# Altium footprint library Conectores.PcbLib: 122 footprints (part 3 of 8)
Each footprint in its own frame and in the unit in brackets; x right, y up, seen from the top. Pads: shape width x height; smd on the part's side, far side on the other; paste and mask are expansions set on the pad; w line width, h text height; cw(c..) or ccw(c..) is an arc to the next point about the centre after c.
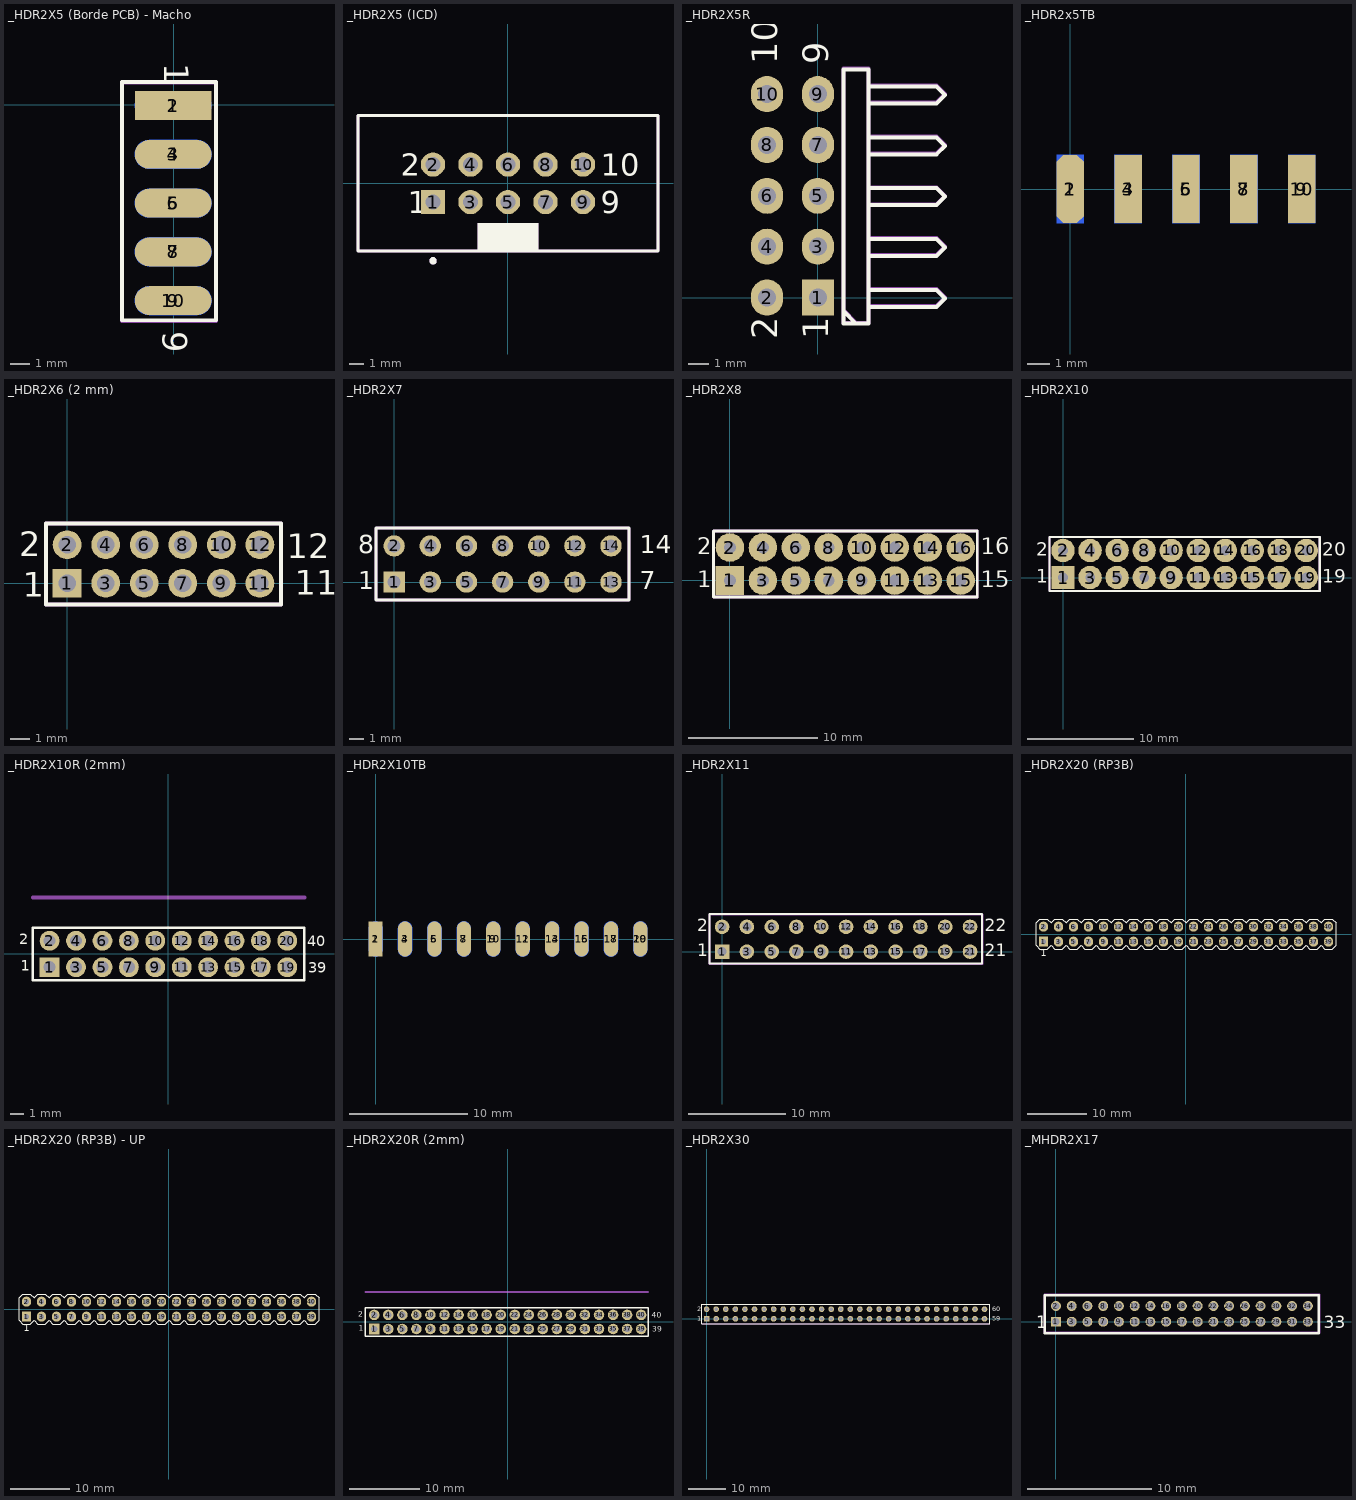
[diagram p2: the footprints below, top view; thin cyan lines are the x and y axes]

## _HDR2X5 (Borde PCB) - Macho [mm] "2 Filas 5 pines para conector macho"
pads (10):
  rect 4x1.5 smd: 1(-0.025,-0.051)
  oval 4x1.5 smd far side: 2(-0.025,-0.051) 4(-0.025,-2.591) 6(-0.025,-5.131) 8(-0.025,-7.671) 10(-0.025,-10.211)
  oval 4x1.5 smd: 3(-0.025,-2.591) 5(-0.025,-5.131) 7(-0.025,-7.671) 9(-0.025,-10.211)
Top Overlay:
  lines w0.2: -2.692,-11.238 -2.692,1.183 2.21,1.183 2.21,-11.238 -2.692,-11.238
  text "9" at -0.559,-11.796 h1.27
  text "1" at -0.483,2.148 h1.27
Mechanical 29:
  lines w0.2: -2.692,-11.278 2.21,-11.278 2.21,1.143 -2.692,1.143 -2.692,-11.278
  text "'.Designator'" at -0.062,0.368 h0.5
  text "1" at -0.483,2.108 h1.27
  text "9" at -0.559,-11.836 h1.27

## _HDR2X5 (ICD) [mm] "2 Filas 5 pines"
pads (10):
  rect 1.65x1.65 hole 1: 1(-5.08,-1.27)
  round 1.65 hole 1: 2(-5.08,1.27) 3(-2.54,-1.27) 4(-2.54,1.27) 5(0,-1.27) 6(0,1.27) 7(2.54,-1.27) 8(2.54,1.27) 9(5.08,-1.27) 10(5.08,1.27)
Top Overlay:
  circle w0.25: c-5.08,-5.25 r0.125
  rectangle: -2.05,-4.6 2.05,-2.7
  lines w0.2: -10.16,-4.6 10.16,-4.6 10.16,4.6 -10.16,4.6 -10.16,-4.6
  text "9" at 6.28,-2.02 h1.5
  text "10" at 6.28,0.52 h1.5
  text "1" at -6.78,-2.02 h1.5
  text "2" at -7.28,0.52 h1.5
Mechanical 13:
  lines w0.1: -10.16,-4.6 10.16,-4.6 10.16,4.6 -10.16,4.6 -10.16,-4.6
Mechanical 29:
  circle w0.25: c-5.08,-5.25 r0.125
  rectangle: -2.05,-4.6 2.05,-2.7
  lines w0.2: -10.16,-4.6 -10.16,4.6 10.16,4.6 10.16,-4.6 -10.16,-4.6
  text "2" at -7.28,0.52 h1.5
  text "1" at -6.78,-2.02 h1.5
  text "10" at 6.28,0.52 h1.5
  text "9" at 6.28,-2.02 h1.5
  text "'.Designator'" at -9.478,-4.062 h0.5
3D body "Header 10 pines ICD.step": height 9.86, standoff -3.05, extent -10.135,-4.572 10.185,4.572

## _HDR2X5R [mm]
pads (10):
  rect 1.6x1.8 hole 0.9: 1(0,0)
  oval 1.6x1.8 hole 0.9: 2(-2.54,0) 3(0,2.54) 4(-2.54,2.54) 5(0,5.08) 6(-2.54,5.08) 7(0,7.62) 8(-2.54,7.62) 9(0,10.16) 10(-2.54,10.16)
Top Overlay:
  lines w0.2: 1.27,-0.675 1.905,-1.31 ; 2.54,-0.463 5.927,-0.463 6.35,-0.04 5.927,0.383 2.54,0.383 ; 2.54,2.077 5.927,2.077 6.35,2.5 5.927,2.923 2.54,2.923 ; 2.54,4.617 5.927,4.617 6.35,5.04 5.927,5.463 2.54,5.463 ; 2.54,7.157 5.927,7.157 6.35,7.58 5.927,8.003 2.54,8.003 ; 2.54,9.697 5.927,9.697 6.35,10.12 5.927,10.543 2.54,10.543 ; 1.27,-1.31 2.54,-1.31 2.54,11.39 1.27,11.39 1.27,-1.31
  text "10" at -2.032,11.644 h1.27
  text "9" at 0.508,11.644 h1.27
  text "1" at 0.508,-2.072 h1.27
  text "2" at -2.032,-2.072 h1.27
Mechanical 29:
  lines w0.2: 1.27,-0.635 1.905,-1.27 ; 2.54,-0.423 5.927,-0.423 6.35,0 5.927,0.423 2.54,0.423 ; 2.54,2.117 5.927,2.117 6.35,2.54 5.927,2.963 2.54,2.963 ; 2.54,4.657 5.927,4.657 6.35,5.08 5.927,5.503 2.54,5.503 ; 2.54,7.197 5.927,7.197 6.35,7.62 5.927,8.043 2.54,8.043 ; 2.54,9.737 5.927,9.737 6.35,10.16 5.927,10.583 2.54,10.583 ; 1.27,-1.27 1.27,11.43 2.54,11.43 2.54,-1.27 1.27,-1.27
  text "2" at -2.032,-2.032 h1.27
  text "1" at 0.508,-2.032 h1.27
  text "9" at 0.508,11.684 h1.27
  text "10" at -2.032,11.684 h1.27
  text "'.Designator'" at 0.232,-0.538 h0.5
3D body "HDR2x5 Right.STEP": height 5.27, standoff -3, extent -2.864,-1.296 8.836,11.404

## _HDR2x5TB [mm]
pads (10):
  oct 1.2x3 smd: 1(0,0)
  rect 1.2x3 smd far side: 2(0,0) 4(2.54,0) 6(5.08,0) 8(7.62,0) 10(10.16,0)
  rect 1.2x3 smd: 3(2.54,0) 5(5.08,0) 7(7.62,0) 9(10.16,0)
Mechanical 29:
  text "'.Designator'" at -0.388,-0.032 h0.5

## _HDR2X6 (2 mm) [mm]
pads (12):
  rect 1.5x1.5 hole 0.9: 1(0,0)
  round 1.5 hole 0.9: 2(0,2) 3(2,0) 4(2,2) 5(4,0) 6(4,2) 7(6,0) 8(6,2) 9(8,0) 10(8,2) 11(10,0) 12(10,2)
Top Overlay:
  lines w0.2: -1.1,-1.1 11.1,-1.1 11.1,3.1 -1.1,3.1 -1.1,-1.1
  text "12" at 11.4,1.3 h1.27
  text "11" at 11.8,-0.6 h1.27
  text "1" at -2.3,-0.7 h1.27
  text "2" at -2.5,1.4 h1.27
Mechanical 29:
  lines w0.2: -1.1,-1.1 -1.1,3.1 11.1,3.1 11.1,-1.1 -1.1,-1.1
  text "'.Designator'" at -0.538,-0.232 h0.5
  text "2" at -2.5,1.4 h1.27
  text "1" at -2.3,-0.7 h1.27
  text "11" at 11.8,-0.6 h1.27
  text "12" at 11.4,1.3 h1.27

## _HDR2X7 [mm]
pads (14):
  rect 1.5x1.5 hole 0.9: 1(0,0)
  round 1.5 hole 0.9: 2(0,2.54) 3(2.54,0) 4(2.54,2.54) 5(5.08,0) 6(5.08,2.54) 7(7.62,0) 8(7.62,2.54) 9(10.16,0) 10(10.16,2.54) 11(12.7,0) 12(12.7,2.54) 13(15.24,0) 14(15.24,2.54)
Top Overlay:
  lines w0.2: -1.27,-1.27 16.51,-1.27 16.51,3.81 -1.27,3.81 -1.27,-1.27
  text "8" at -2.54,2.032 h1.27
  text "1" at -2.54,-0.508 h1.27
  text "7" at 17.272,-0.508 h1.27
  text "14" at 17.272,2.032 h1.27
Mechanical 29:
  lines w0.2: -1.27,-1.27 -1.27,3.81 16.51,3.81 16.51,-1.27 -1.27,-1.27
  text "'.Designator'" at -0.538,-0.232 h0.5
  text "14" at 17.272,2.032 h1.27
  text "7" at 17.272,-0.508 h1.27
  text "1" at -2.54,-0.508 h1.27
  text "8" at -2.54,2.032 h1.27
3D body "_HDR2x7.STEP": height 10.1, standoff -1.5, extent -1.27,-1.27 16.51,3.81

## _HDR2X8 [mm]
pads (16):
  rect 2.2x2.2 hole 0.9: 1(0,0)
  round 2.2 hole 0.9: 2(0,2.54) 3(2.54,0) 4(2.54,2.54) 5(5.08,0) 6(5.08,2.54) 7(7.62,0) 8(7.62,2.54) 9(10.16,0) 10(10.16,2.54) 11(12.7,0) 12(12.7,2.54) 13(15.24,0) 14(15.24,2.54) 15(17.78,0) 16(17.78,2.54)
Top Overlay:
  lines w0.2: -1.27,-1.27 -1.27,3.81 19.05,3.81 19.05,-1.27 -1.27,-1.27
  text "2" at -2.54,2.032 h1.27
  text "1" at -2.54,-0.508 h1.27
  text "15" at 19.304,-0.508 h1.27
  text "16" at 19.304,2.032 h1.27
Mechanical 29:
  lines w0.2: -1.27,-1.27 19.05,-1.27 19.05,3.81 -1.27,3.81 -1.27,-1.27
  text "16" at 19.304,2.032 h1.27
  text "15" at 19.304,-0.508 h1.27
  text "1" at -2.54,-0.508 h1.27
  text "2" at -2.54,2.032 h1.27
  text "'.Designator'" at -0.538,-0.232 h0.5
3D body "_HDR2x8.STEP": height 10.1, standoff -1.5, extent -1.295,-1.295 19.025,3.785

## _HDR2X10 [mm]
pads (20):
  rect 2.2x2.2 hole 0.9: 1(0,0)
  round 2.2 hole 0.9: 2(0,2.54) 3(2.54,0) 4(2.54,2.54) 5(5.08,0) 6(5.08,2.54) 7(7.62,0) 8(7.62,2.54) 9(10.16,0) 10(10.16,2.54) 11(12.7,0) 12(12.7,2.54) 13(15.24,0) 14(15.24,2.54) 15(17.78,0) 16(17.78,2.54) 17(20.32,0) 18(20.32,2.54) 19(22.86,0) 20(22.86,2.54)
Top Overlay:
  lines w0.2: -1.27,-1.27 -1.27,3.81 0.635,3.81 24.13,3.81 24.13,-1.27 0.635,-1.27 -1.27,-1.27
  text "2" at -2.54,2.032 h1.27
  text "1" at -2.54,-0.508 h1.27
  text "19" at 24.384,-0.508 h1.27
  text "20" at 24.384,2.032 h1.27
Mechanical 29:
  lines w0.2: -1.27,-1.27 0.635,-1.27 24.13,-1.27 24.13,3.81 0.635,3.81 -1.27,3.81 -1.27,-1.27
  text "'.Designator'" at -0.538,-0.232 h0.5
  text "20" at 24.384,2.032 h1.27
  text "19" at 24.384,-0.508 h1.27
  text "1" at -2.54,-0.508 h1.27
  text "2" at -2.54,2.032 h1.27
3D body "_HDR2x10.STEP": height 10.1, standoff -1.5, extent -1.27,-1.27 24.13,3.81

## _HDR2X10R (2mm) [mm] "Connector Socket; 20x2 Position (2mm pitch) P/N: TMMH-110-01-L-D-RA"
pads (20):
  rect 1.5x1.5 hole 0.9: 1(-9,-1)
  round 1.5 hole 0.9: 2(-9,1) 3(-7,-1) 4(-7,1) 5(-5,-1) 6(-5,1) 7(-3,-1) 8(-3,1) 9(-1,-1) 10(-1,1) 11(1,-1) 12(1,1) 13(3,-1) 14(3,1) 15(5,-1) 16(5,1) 17(7,-1) 18(7,1) 19(9,-1) 20(9,1)
Top Overlay:
  lines w0.2: -10.27,-2 10.27,-2 10.27,2 -10.27,2 -10.27,-2
  text "1" at -11.19,-1.27 h0.8
  text "2" at -11.32,0.75 h0.8
  text "40" at 10.52,0.58 h0.8
  text "39" at 10.6,-1.42 h0.8
Mechanical 1:
  lines w0.3: -10.25,4.27 10.3,4.27
3D body "TMMH-110-01-L-D-RA.stp": height 4.04, standoff -2.56, extent -10,-1.265 10,7.465

## _HDR2X10TB [mm]
pads (20):
  rect 1.2x3 smd: 1(0,0)
  oval 1.2x3 smd far side: 2(0,0) 4(2.5,0) 6(5,0) 8(7.5,0) 10(10,0) 12(12.5,0) 14(15,0) 16(17.5,0) 18(20,0) 20(22.5,0)
  oval 1.2x3 smd: 3(2.5,0) 5(5,0) 7(7.5,0) 9(10,0) 11(12.5,0) 13(15,0) 15(17.5,0) 17(20,0) 19(22.5,0)
Mechanical 29:
  text "'.Designator'" at -0.378,-0.042 h0.5
3D body "_HDR2x10.STEP": height 1.27, standoff -3.81, extent -1.499,-11.422 23.901,0.178

## _HDR2X11 [mm] "Connector; Header; 11x2 Position"
pads (22):
  rect 1.5x1.5 hole 0.9: 1(0,0)
  round 1.5 hole 0.9: 2(0,2.54) 3(2.54,0) 4(2.54,2.54) 5(5.08,0) 6(5.08,2.54) 7(7.62,0) 8(7.62,2.54) 9(10.16,0) 10(10.16,2.54) 11(12.7,0) 12(12.7,2.54) 13(15.24,0) 14(15.24,2.54) 15(17.78,0) 16(17.78,2.54) 17(20.32,0) 18(20.32,2.54) 19(22.86,0) 20(22.86,2.54) 21(25.4,0) 22(25.4,2.54)
Top Overlay:
  lines w0.2: -1.3,-1.22 -1.3,3.86 26.64,3.86 26.64,-1.22 -1.3,-1.22
  text "1" at -2.57,-0.458 h1.27
  text "2" at -2.57,2.082 h1.27
  text "21" at 26.894,-0.458 h1.27
  text "22" at 26.894,2.082 h1.27
Mechanical 29:
  lines w0.2: -1.27,-1.27 26.67,-1.27 26.67,3.81 -1.27,3.81 -1.27,-1.27
  text "22" at 26.924,2.032 h1.27
  text "21" at 26.924,-0.508 h1.27
  text "2" at -2.54,2.032 h1.27
  text "1" at -2.54,-0.508 h1.27
  text "'.Designator'" at -0.538,-0.232 h0.5

## _HDR2X20 (RP3B) [mm] "Conector Raspberry Pi 3B"
pads (40):
  rect 1.6x1.7 hole 0.9: 1(-24.13,-1.27)
  oval 1.6x1.7 hole 0.9: 2(-24.13,1.27) 3(-21.59,-1.27) 4(-21.59,1.27) 5(-19.05,-1.27) 6(-19.05,1.27) 7(-16.51,-1.27) 8(-16.51,1.27) 9(-13.97,-1.27) 10(-13.97,1.27) 11(-11.43,-1.27) 12(-11.43,1.27) 13(-8.89,-1.27) 14(-8.89,1.27) 15(-6.35,-1.27) 16(-6.35,1.27) 17(-3.81,-1.27) 18(-3.81,1.27) 19(-1.27,-1.27) 20(-1.27,1.27) 21(1.27,-1.27) 22(1.27,1.27) 23(3.81,-1.27) 24(3.81,1.27) 25(6.35,-1.27) 26(6.35,1.27) 27(8.89,-1.27) 28(8.89,1.27) 29(11.43,-1.27) 30(11.43,1.27) 31(13.97,-1.27) 32(13.97,1.27) 33(16.51,-1.27) 34(16.51,1.27) 35(19.05,-1.27) 36(19.05,1.27) 37(21.59,-1.27) 38(21.59,1.27) 39(24.13,-1.27) 40(24.13,1.27)
Top Overlay:
  lines w0.152: -25.4,-1.905 -25.4,1.905 -24.765,2.54 -23.495,2.54 -22.86,1.905 -22.225,2.54 -20.955,2.54 -20.32,1.905 -19.685,2.54 -18.415,2.54 -17.78,1.905 -17.145,2.54 -15.875,2.54 -15.24,1.905 -14.605,2.54 -13.335,2.54 -12.7,1.905 -12.065,2.54 -10.795,2.54 -10.16,1.905 -9.525,2.54 -8.255,2.54 -7.62,1.905 -6.985,2.54 -5.715,2.54 -5.08,1.905 -4.445,2.54 -3.175,2.54 -2.54,1.905 -1.905,2.54 -0.635,2.54 0,1.905 0.635,2.54 1.905,2.54 2.54,1.905 3.175,2.54 4.445,2.54 5.08,1.905 5.715,2.54 6.985,2.54 7.62,1.905 8.255,2.54 9.525,2.54 10.16,1.905 10.795,2.54 12.065,2.54 12.7,1.905 13.335,2.54 14.605,2.54 15.24,1.905 15.875,2.54 17.145,2.54 17.78,1.905 18.415,2.54 19.685,2.54 20.32,1.905 20.955,2.54 22.225,2.54 22.86,1.905 23.495,2.54 24.765,2.54 25.4,1.905 25.4,-1.905 24.765,-2.54 23.495,-2.54 22.86,-1.905 22.225,-2.54 20.955,-2.54 20.32,-1.905 19.685,-2.54 18.415,-2.54 17.78,-1.905 17.145,-2.54 15.875,-2.54 15.24,-1.905 14.605,-2.54 13.335,-2.54 12.7,-1.905 12.065,-2.54 10.795,-2.54 10.16,-1.905 9.525,-2.54 8.255,-2.54 7.62,-1.905 6.985,-2.54 5.715,-2.54 5.08,-1.905 4.445,-2.54 3.175,-2.54 2.54,-1.905 1.905,-2.54 0.635,-2.54 0,-1.905 -0.635,-2.54 -1.905,-2.54 -2.54,-1.905 -3.175,-2.54 -4.445,-2.54 -5.08,-1.905 -5.715,-2.54 -6.985,-2.54 -7.62,-1.905 -8.255,-2.54 -9.525,-2.54 -10.16,-1.905 -10.795,-2.54 -12.065,-2.54 -12.7,-1.905 -13.335,-2.54 -14.605,-2.54 -15.24,-1.905 -15.875,-2.54 -17.145,-2.54 -17.78,-1.905 -18.415,-2.54 -19.685,-2.54 -20.32,-1.905 -20.955,-2.54 -22.225,-2.54 -22.86,-1.905 -23.495,-2.54 -24.765,-2.54 -25.4,-1.905
  text "1" at -24.638,-4.191 h1.97
Mechanical 16:
  rectangle: -21.844,-1.524 -21.336,-1.016
  rectangle: -24.384,-1.524 -23.876,-1.016
  rectangle: -19.304,-1.524 -18.796,-1.016
  rectangle: -14.224,-1.524 -13.716,-1.016
  rectangle: -16.764,-1.524 -16.256,-1.016
  rectangle: -11.684,-1.524 -11.176,-1.016
  rectangle: -24.384,1.016 -23.876,1.524
  rectangle: -21.844,1.016 -21.336,1.524
  rectangle: -19.304,1.016 -18.796,1.524
  rectangle: -16.764,1.016 -16.256,1.524
  rectangle: -14.224,1.016 -13.716,1.524
  rectangle: -11.684,1.016 -11.176,1.524
  rectangle: -9.144,1.016 -8.636,1.524
  rectangle: -9.144,-1.524 -8.636,-1.016
  rectangle: -4.064,-1.524 -3.556,-1.016
  rectangle: -6.604,-1.524 -6.096,-1.016
  rectangle: -1.524,-1.524 -1.016,-1.016
  rectangle: 3.556,-1.524 4.064,-1.016
  rectangle: 1.016,-1.524 1.524,-1.016
  rectangle: 6.096,-1.524 6.604,-1.016
  rectangle: -6.604,1.016 -6.096,1.524
  rectangle: -4.064,1.016 -3.556,1.524
  rectangle: -1.524,1.016 -1.016,1.524
  rectangle: 1.016,1.016 1.524,1.524
  rectangle: 3.556,1.016 4.064,1.524
  rectangle: 6.096,1.016 6.604,1.524
  rectangle: 8.636,1.016 9.144,1.524
  rectangle: 8.636,-1.524 9.144,-1.016
  rectangle: 13.716,-1.524 14.224,-1.016
  rectangle: 11.176,-1.524 11.684,-1.016
  rectangle: 16.256,-1.524 16.764,-1.016
  rectangle: 21.336,-1.524 21.844,-1.016
  rectangle: 18.796,-1.524 19.304,-1.016
  rectangle: 23.876,-1.524 24.384,-1.016
  rectangle: 11.176,1.016 11.684,1.524
  rectangle: 13.716,1.016 14.224,1.524
  rectangle: 16.256,1.016 16.764,1.524
  rectangle: 18.796,1.016 19.304,1.524
  rectangle: 21.336,1.016 21.844,1.524
  rectangle: 23.876,1.016 24.384,1.524
3D body "Header 2x20 2_54mm.STEP": height 2.18, standoff -8.92, extent -25.54,-2.48 25.56,2.52

## _HDR2X20 (RP3B) - UP [mm] "Conector Raspberry Pi 3B"
pads (40):
  rect 1.6x1.7 hole 0.9: 1(-24.13,-1.27)
  oval 1.6x1.7 hole 0.9: 2(-24.13,1.27) 3(-21.59,-1.27) 4(-21.59,1.27) 5(-19.05,-1.27) 6(-19.05,1.27) 7(-16.51,-1.27) 8(-16.51,1.27) 9(-13.97,-1.27) 10(-13.97,1.27) 11(-11.43,-1.27) 12(-11.43,1.27) 13(-8.89,-1.27) 14(-8.89,1.27) 15(-6.35,-1.27) 16(-6.35,1.27) 17(-3.81,-1.27) 18(-3.81,1.27) 19(-1.27,-1.27) 20(-1.27,1.27) 21(1.27,-1.27) 22(1.27,1.27) 23(3.81,-1.27) 24(3.81,1.27) 25(6.35,-1.27) 26(6.35,1.27) 27(8.89,-1.27) 28(8.89,1.27) 29(11.43,-1.27) 30(11.43,1.27) 31(13.97,-1.27) 32(13.97,1.27) 33(16.51,-1.27) 34(16.51,1.27) 35(19.05,-1.27) 36(19.05,1.27) 37(21.59,-1.27) 38(21.59,1.27) 39(24.13,-1.27) 40(24.13,1.27)
Top Overlay:
  lines w0.152: -25.4,-1.905 -25.4,1.905 -24.765,2.54 -23.495,2.54 -22.86,1.905 -22.225,2.54 -20.955,2.54 -20.32,1.905 -19.685,2.54 -18.415,2.54 -17.78,1.905 -17.145,2.54 -15.875,2.54 -15.24,1.905 -14.605,2.54 -13.335,2.54 -12.7,1.905 -12.065,2.54 -10.795,2.54 -10.16,1.905 -9.525,2.54 -8.255,2.54 -7.62,1.905 -6.985,2.54 -5.715,2.54 -5.08,1.905 -4.445,2.54 -3.175,2.54 -2.54,1.905 -1.905,2.54 -0.635,2.54 0,1.905 0.635,2.54 1.905,2.54 2.54,1.905 3.175,2.54 4.445,2.54 5.08,1.905 5.715,2.54 6.985,2.54 7.62,1.905 8.255,2.54 9.525,2.54 10.16,1.905 10.795,2.54 12.065,2.54 12.7,1.905 13.335,2.54 14.605,2.54 15.24,1.905 15.875,2.54 17.145,2.54 17.78,1.905 18.415,2.54 19.685,2.54 20.32,1.905 20.955,2.54 22.225,2.54 22.86,1.905 23.495,2.54 24.765,2.54 25.4,1.905 25.4,-1.905 24.765,-2.54 23.495,-2.54 22.86,-1.905 22.225,-2.54 20.955,-2.54 20.32,-1.905 19.685,-2.54 18.415,-2.54 17.78,-1.905 17.145,-2.54 15.875,-2.54 15.24,-1.905 14.605,-2.54 13.335,-2.54 12.7,-1.905 12.065,-2.54 10.795,-2.54 10.16,-1.905 9.525,-2.54 8.255,-2.54 7.62,-1.905 6.985,-2.54 5.715,-2.54 5.08,-1.905 4.445,-2.54 3.175,-2.54 2.54,-1.905 1.905,-2.54 0.635,-2.54 0,-1.905 -0.635,-2.54 -1.905,-2.54 -2.54,-1.905 -3.175,-2.54 -4.445,-2.54 -5.08,-1.905 -5.715,-2.54 -6.985,-2.54 -7.62,-1.905 -8.255,-2.54 -9.525,-2.54 -10.16,-1.905 -10.795,-2.54 -12.065,-2.54 -12.7,-1.905 -13.335,-2.54 -14.605,-2.54 -15.24,-1.905 -15.875,-2.54 -17.145,-2.54 -17.78,-1.905 -18.415,-2.54 -19.685,-2.54 -20.32,-1.905 -20.955,-2.54 -22.225,-2.54 -22.86,-1.905 -23.495,-2.54 -24.765,-2.54 -25.4,-1.905
  text "1" at -24.638,-4.191 h1.97
Mechanical 16:
  rectangle: -21.844,-1.524 -21.336,-1.016
  rectangle: -24.384,-1.524 -23.876,-1.016
  rectangle: -19.304,-1.524 -18.796,-1.016
  rectangle: -14.224,-1.524 -13.716,-1.016
  rectangle: -16.764,-1.524 -16.256,-1.016
  rectangle: -11.684,-1.524 -11.176,-1.016
  rectangle: -24.384,1.016 -23.876,1.524
  rectangle: -21.844,1.016 -21.336,1.524
  rectangle: -19.304,1.016 -18.796,1.524
  rectangle: -16.764,1.016 -16.256,1.524
  rectangle: -14.224,1.016 -13.716,1.524
  rectangle: -11.684,1.016 -11.176,1.524
  rectangle: -9.144,1.016 -8.636,1.524
  rectangle: -9.144,-1.524 -8.636,-1.016
  rectangle: -4.064,-1.524 -3.556,-1.016
  rectangle: -6.604,-1.524 -6.096,-1.016
  rectangle: -1.524,-1.524 -1.016,-1.016
  rectangle: 3.556,-1.524 4.064,-1.016
  rectangle: 1.016,-1.524 1.524,-1.016
  rectangle: 6.096,-1.524 6.604,-1.016
  rectangle: -6.604,1.016 -6.096,1.524
  rectangle: -4.064,1.016 -3.556,1.524
  rectangle: -1.524,1.016 -1.016,1.524
  rectangle: 1.016,1.016 1.524,1.524
  rectangle: 3.556,1.016 4.064,1.524
  rectangle: 6.096,1.016 6.604,1.524
  rectangle: 8.636,1.016 9.144,1.524
  rectangle: 8.636,-1.524 9.144,-1.016
  rectangle: 13.716,-1.524 14.224,-1.016
  rectangle: 11.176,-1.524 11.684,-1.016
  rectangle: 16.256,-1.524 16.764,-1.016
  rectangle: 21.336,-1.524 21.844,-1.016
  rectangle: 18.796,-1.524 19.304,-1.016
  rectangle: 23.876,-1.524 24.384,-1.016
  rectangle: 11.176,1.016 11.684,1.524
  rectangle: 13.716,1.016 14.224,1.524
  rectangle: 16.256,1.016 16.764,1.524
  rectangle: 18.796,1.016 19.304,1.524
  rectangle: 21.336,1.016 21.844,1.524
  rectangle: 23.876,1.016 24.384,1.524
3D body "Header 2x20 2_54mm.STEP": height 8.5, standoff -2.6, extent -25.54,-2.48 25.56,2.52

## _HDR2X20R (2mm) [mm] "Connector Socket; 20x2 Position (2mm pitch) P/N: TMMH-120-01-L-D-RA"
pads (40):
  rect 1.5x1.5 hole 0.9: 1(-19,-1)
  round 1.5 hole 0.9: 2(-19,1) 3(-17,-1) 4(-17,1) 5(-15,-1) 6(-15,1) 7(-13,-1) 8(-13,1) 9(-11,-1) 10(-11,1) 11(-9,-1) 12(-9,1) 13(-7,-1) 14(-7,1) 15(-5,-1) 16(-5,1) 17(-3,-1) 18(-3,1) 19(-1,-1) 20(-1,1) 21(1,-1) 22(1,1) 23(3,-1) 24(3,1) 25(5,-1) 26(5,1) 27(7,-1) 28(7,1) 29(9,-1) 30(9,1) 31(11,-1) 32(11,1) 33(13,-1) 34(13,1) 35(15,-1) 36(15,1) 37(17,-1) 38(17,1) 39(19,-1) 40(19,1)
Top Overlay:
  lines w0.2: -20.27,-2 -20.27,2 20,2 20,-2 -20.27,-2
  text "39" at 20.6,-1.42 h0.8
  text "40" at 20.52,0.58 h0.8
  text "2" at -21.32,0.75 h0.8
  text "1" at -21.19,-1.27 h0.8
Mechanical 1:
  lines w0.3: -20.25,4.27 19.95,4.27
3D body "TMMH-120-01-L-D-RA.stp": height 4.04, standoff -2.56, extent -20,-1.274 20,7.457

## _HDR2X30 [mm]
pads (60):
  rect 1.5x1.5 hole 0.9: 1(0,0)
  round 1.5 hole 0.9: 2(0,2.54) 3(2.54,0) 4(2.54,2.54) 5(5.08,0) 6(5.08,2.54) 7(7.62,0) 8(7.62,2.54) 9(10.16,0) 10(10.16,2.54) 11(12.7,0) 12(12.7,2.54) 13(15.24,0) 14(15.24,2.54) 15(17.78,0) 16(17.78,2.54) 17(20.32,0) 18(20.32,2.54) 19(22.86,0) 20(22.86,2.54) 21(25.4,0) 22(25.4,2.54) 23(27.94,0) 24(27.94,2.54) 25(30.48,0) 26(30.48,2.54) 27(33.02,0) 28(33.02,2.54) 29(35.56,0) 30(35.56,2.54) 31(38.1,0) 32(38.1,2.54) 33(40.64,0) 34(40.64,2.54) 35(43.18,0) 36(43.18,2.54) 37(45.72,0) 38(45.72,2.54) 39(48.26,0) 40(48.26,2.54) 41(50.8,0) 42(50.8,2.54) 43(53.34,0) 44(53.34,2.54) 45(55.88,0) 46(55.88,2.54) 47(58.42,0) 48(58.42,2.54) 49(60.96,0) 50(60.96,2.54) 51(63.5,0) 52(63.5,2.54) 53(66.04,0) 54(66.04,2.54) 55(68.58,0) 56(68.58,2.54) 57(71.12,0) 58(71.12,2.54) 59(73.66,0) 60(73.66,2.54)
Top Overlay:
  lines w0.2: -1.27,-1.27 -1.27,3.81 75.06,3.81 75.06,-1.27 -1.27,-1.27
  text "2" at -2.54,2.032 h1.27
  text "1" at -2.54,-0.508 h1.27
  text "59" at 75.692,-0.508 h1.27
  text "60" at 75.692,2.032 h1.27
Mechanical 29:
  lines w0.2: -1.27,-1.27 75.06,-1.27 75.06,3.81 -1.27,3.81 -1.27,-1.27
  text "'.Designator'" at -0.538,-0.232 h0.5
  text "60" at 75.692,2.032 h1.27
  text "59" at 75.692,-0.508 h1.27
  text "1" at -2.54,-0.508 h1.27
  text "2" at -2.54,2.032 h1.27
3D body "_HDR2x30.STEP": height 10.1, standoff -1.5, extent -1.295,-1.245 74.905,3.835

## _MHDR2X17 [mm]
pads (34):
  rect 0.8x0.8 hole 0.6: 1(0,0)
  round 0.8 hole 0.6: 2(0,1.27) 3(1.27,0) 4(1.27,1.27) 5(2.54,0) 6(2.54,1.27) 7(3.81,0) 8(3.81,1.27) 9(5.08,0) 10(5.08,1.27) 11(6.35,0) 12(6.35,1.27) 13(7.62,0) 14(7.62,1.27) 15(8.89,0) 16(8.89,1.27) 17(10.16,0) 18(10.16,1.27) 19(11.43,0) 20(11.43,1.27) 21(12.7,0) 22(12.7,1.27) 23(13.97,0) 24(13.97,1.27) 25(15.24,0) 26(15.24,1.27) 27(16.51,0) 28(16.51,1.27) 29(17.78,0) 30(17.78,1.27) 31(19.05,0) 32(19.05,1.27) 33(20.32,0) 34(20.32,1.27)
Top Overlay:
  lines w0.2: -0.91,-0.92 -0.91,2.15 21.21,2.15 21.21,-0.92 -0.91,-0.92
  text "1" at -1.61,-0.528 h1
  text "33" at 21.59,-0.528 h1
Mechanical 29:
  lines w0.2: -0.9,-0.9 21.22,-0.9 21.22,2.17 -0.9,2.17 -0.9,-0.9
  text "'.Designator'" at -0.538,-0.232 h0.5
  text "33" at 21.6,-0.508 h1
  text "1" at -1.6,-0.508 h1
3D body "PLLD1_27-2x17.step": height 4.7, standoff -2.6, extent -0.659,-0.832 20.931,2.168